# Altium footprint library CONNs.PcbLib: 27 footprints (part 2 of 2)
Each footprint in its own frame and in the unit in brackets; x right, y up, seen from the top. Pads: shape width x height; smd on the part's side, far side on the other; paste and mask are expansions set on the pad; w line width, h text height; cw(c..) or ccw(c..) is an arc to the next point about the centre after c.
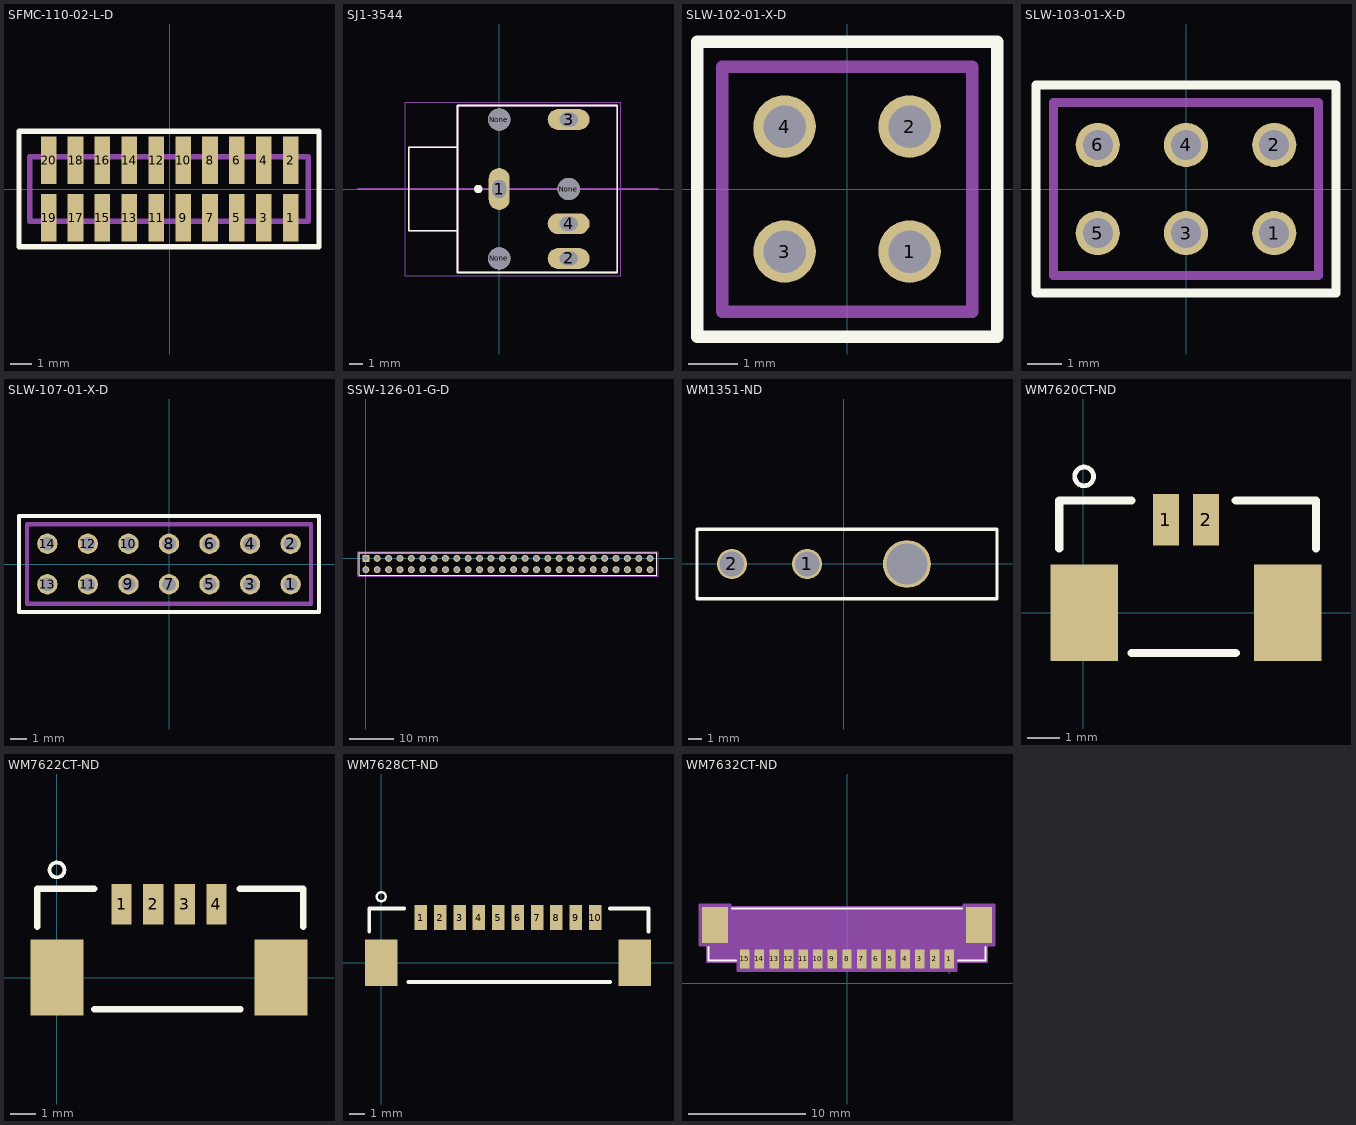
[diagram p1: the footprints below, top view; thin cyan lines are the x and y axes]

## SFMC-110-02-L-D [mil] "CONN RCPT 20POS 0.05 GOLD SMD"
height 179.92
pads (20):
  rect 29x88 smd: 1(225,-53.5) 2(225,53.5) 3(175,-53.5) 4(175,53.5) 5(125,-53.5) 6(125,53.5) 7(75,-53.5) 8(75,53.5) 9(25,-53.5) 10(25,53.5) 11(-25,-53.5) 12(-25,53.5) 13(-75,-53.5) 14(-75,53.5) 15(-125,-53.5) 16(-125,53.5) 17(-175,-53.5) 18(-175,53.5) 19(-225,-53.5) 20(-225,53.5)
Top Overlay:
  lines w10: -280,-107.5 -280,107.5 277.5,107.5 277.5,-107.5 -280,-107.5
Mechanical 1:
  lines w10: -260,-60 -260,60 257.5,60 257.5,-60 -260,-60
3D body "SFMC-110-02-L-D.stp": height 180, standoff -5, extent -257.5,-82.5 257.5,82.5

## SJ1-3544 [mm] "3.5mm audio jack"
height 11
pads (7):
  oval 1.508x3.016 hole 1 slot 1.3 at 90 deg: 1(0,0)
  oval 3.016x1.508 hole 1 slot 1.3 at 0 deg: 2(5,-5) 3(5,5) 4(5,-2.5)
  round 1.6 hole 1.6 unplated: None(0,-5) None(0,5) None(5,0)
Top Overlay:
  circle w0.3: c-1.5,0 r0.15
  lines w0.127: -3,-3 -6.5,-3 -6.5,3 -3,3 ; -3,-3 -3,-6 8.5,-6 8.5,6 -3,6 -3,3 ; -3,-3 -3,3
Mechanical 1:
  lines w0.127: -10.16,0 11.43,0 ; -3,-3 -6.5,-3 -6.5,3 -3,3 ; -3,-3 -3,3 ; -3,-3 -3,-6 8.5,-6 8.5,6 -3,6 -3,3
Mechanical 4:
  lines w0: -0.5,-0.75 -0.5,0.75 0.5,0.75 0.5,-0.75 -0.5,-0.75 ; 4.25,-5.5 5.75,-5.5 5.75,-4.5 4.25,-4.5 4.25,-5.5 ; 4.25,-3 5.75,-3 5.75,-2 4.25,-2 4.25,-3 ; 4.25,4.5 5.75,4.5 5.75,5.5 4.25,5.5 4.25,4.5
  lines w0.05: -6.75,-6.25 -6.75,6.25 8.75,6.25 8.75,-6.25 -6.75,-6.25
3D body: height 9.96, standoff -6.83, extent 2,2.5 2,2.5
3D body "[RBF] CUI_SJ1-3544 v1.step": height 11.4, standoff -3.6, extent -6.5,-6 8.5,6.2

## SLW-102-01-X-D [mil] "CONN RCPT 4POS 0.1 GOLD PCB"
height 179.92
pads (4):
  round 50 hole 34: 1(50,-50) 2(50,50) 3(-50,-50) 4(-50,50)
Top Overlay:
  lines w10: -120,-118 -120,118 120,118 120,-118 -120,-118
Mechanical 1:
  lines w10: -100,-98 -100,98 100,98 100,-98 -100,-98
3D body "SLW-102-01-G-D.stp": height 180, standoff -115, extent -100,-97.5 100,97.5

## SLW-103-01-X-D [mil] "CONN RCPT 6POS 0.1 GOLD PCB"
height 179.92
pads (6):
  round 50 hole 34: 1(100,-50) 2(100,50) 3(0,-50) 4(0,50) 5(-100,-50) 6(-100,50)
Top Overlay:
  lines w10: -170,-118 170,-118 170,118 -170,118 -170,-118
Mechanical 1:
  lines w10: -150,-98 150,-98 150,98 -150,98 -150,-98
3D body "SLW-103-01-G-D.stp": height 180, standoff -115, extent -150,-97.5 150,97.5

## SLW-107-01-X-D [mil]
pads (14):
  round 50 hole 34: 1(300,-50) 2(300,50) 3(200,-50) 4(200,50) 5(100,-50) 6(100,50) 7(0,-50) 8(0,50) 9(-100,-50) 10(-100,50) 11(-200,-50) 12(-200,50) 13(-300,-50) 14(-300,50)
Top Overlay:
  lines w10: -370,-118 370,-118 370,118 -370,118 -370,-118
Mechanical 1:
  lines w10: -350,-98 350,-98 350,98 -350,98 -350,-98
3D body "SLW-107-01-G-D.stp": height 180, standoff -115, extent -350,-97.5 350,97.5

## SSW-126-01-G-D [mm] "Elevated Socket, 2x26 Pins, Vertical, 2.54mm Pitch, Female"
height 8.51
pads (52):
  rect 1.55x1.55 hole 1.02: 1(0,0)
  round 1.55 hole 1.02: 2(0,-2.54) 3(2.54,0) 4(2.54,-2.54) 5(5.08,0) 6(5.08,-2.54) 7(7.62,0) 8(7.62,-2.54) 9(10.16,0) 10(10.16,-2.54) 11(12.7,0) 12(12.7,-2.54) 13(15.24,0) 14(15.24,-2.54) 15(17.78,0) 16(17.78,-2.54) 17(20.32,0) 18(20.32,-2.54) 19(22.86,0) 20(22.86,-2.54) 21(25.4,0) 22(25.4,-2.54) 23(27.94,0) 24(27.94,-2.54) 25(30.48,0) 26(30.48,-2.54) 27(33.02,0) 28(33.02,-2.54) 29(35.56,0) 30(35.56,-2.54) 31(38.1,0) 32(38.1,-2.54) 33(40.64,0) 34(40.64,-2.54) 35(43.18,0) 36(43.18,-2.54) 37(45.72,0) 38(45.72,-2.54) 39(48.26,0) 40(48.26,-2.54) 41(50.8,0) 42(50.8,-2.54) 43(53.34,0) 44(53.34,-2.54) 45(55.88,0) 46(55.88,-2.54) 47(58.42,0) 48(58.42,-2.54) 49(60.96,0) 50(60.96,-2.54) 51(63.5,0) 52(63.5,-2.54)
Top Overlay:
  lines w0.2: -1.525,-3.745 65.025,-3.745 65.025,1.205 -1.525,1.205 -1.525,-3.745
Mechanical 13:
  lines w0.1: -1.525,-3.745 -1.525,1.205 65.025,1.205 65.025,-3.745 -1.525,-3.745
Mechanical 15:
  lines w0.05: -1.75,-3.97 65.25,-3.97 65.25,1.43 -1.75,1.43 -1.75,-3.97
3D body "SSW-126-01-G-D.stp": height 8.51, standoff -2.64, extent -1.524,-3.746 65.024,1.207

## WM1351-ND [mm]
height 9.6
pads (3):
  round 2.2 hole 1.8: 1(-2.66,0) 2(-8.16,0)
  round 3.5 hole 3: ""(4.64,0)
Top Overlay:
  lines w0.254: -10.71,-2.55 -10.71,2.55 11.22,2.55 11.22,-2.55 -10.71,-2.55
3D body "039301020.stp": height 11.4, standoff -3.6, extent -8.824,-2.879 11.11,2.921

## WM7620CT-ND [mm] "Molex PicoBlade 53261 2 Pos"
height 3.2
pads (4):
  rect 0.8x1.6 smd: 1(2.575,2.9) 2(3.825,2.9)
  rect 2.1x3 smd: ""(0.025,0) ""(6.375,0)
Top Overlay:
  circle w0.15: c0.025,4.25 r0.293
  lines w0.254: -0.75,2 -0.75,3.5 1.5,3.5 ; 1.5,-1.25 4.75,-1.25 ; 4.75,3.5 7.25,3.5 7.25,2
3D body "[PicoBlade 2 Pos] 532610271.stp": height 3.4, standoff 0, extent -0.575,-1.838 7.075,3.362

## WM7622CT-ND [mm] "Molex 4-Pos PicoBlade 53261"
height 3.2
pads (6):
  rect 0.8x1.6 smd: 1(2.55,2.9) 2(3.8,2.9) 3(5.05,2.9) 4(6.3,2.9)
  rect 2.1x3 smd: ""(0,0) ""(8.85,0)
Top Overlay:
  circle w0.15: c0,4.25 r0.293
  lines w0.254: -0.775,2 -0.775,3.5 1.475,3.5 ; 1.475,-1.25 7.25,-1.25 ; 7.225,3.5 9.725,3.5 9.725,2
3D body "[PicoBlade 4 Pos] 532610471.stp": height 3.4, standoff 0, extent -0.63,-1.771 9.52,3.429

## WM7628CT-ND [mm] "Molex PicoBlade 53261 10-Pos"
height 4.7
pads (12):
  rect 0.8x1.6 smd: 1(2.55,2.9) 2(3.8,2.9) 3(5.05,2.9) 4(6.3,2.9) 5(7.55,2.9) 6(8.8,2.9) 7(10.05,2.9) 8(11.3,2.9) 9(12.55,2.9) 10(13.8,2.9)
  rect 2.1x3 smd: ""(0,0) ""(16.35,0)
Top Overlay:
  circle w0.15: c0,4.25 r0.293
  lines w0.254: -0.775,2 -0.775,3.5 1.475,3.5 ; 1.75,-1.25 14.75,-1.25 ; 14.75,3.5 17.25,3.5 17.25,2
3D body "[PicoBlade 10 Pos] 532611071.stp": height 3.4, standoff 0, extent -0.57,-1.737 17.08,3.463

## WM7632CT-ND [mil] "Molex PicoBlade 53261 15 Pos"
pads (17):
  rect 32x63 smd: 1(344.49,82.5) 2(295.28,82.5) 3(246.06,82.5) 4(196.85,82.5) 5(147.64,82.5) 6(98.43,82.5) 7(49.21,82.5) 8(0,82.5) 9(-49.21,82.5) 10(-98.43,82.5) 11(-147.64,82.5) 12(-196.85,82.5) 13(-246.06,82.5) 14(-295.28,82.5) 15(-344.49,82.5)
  rect 87x122 smd: ""(-444.88,196.67) ""(444.88,196.67)
Top Overlay:
  lines w6: -467.5,122.57 -467.5,77.5 -373.59,77.5 ; -388.28,252.5 388.28,252.5 ; 373.59,77.5 467.5,77.5 467.5,122.57
Mechanical 13:
  lines w1: 319.49,82.5 344.49,32.5 369.49,82.5 ; -462.5,82.5 -462.5,247.5 462.5,247.5 462.5,82.5 -462.5,82.5
Mechanical 15:
  region: 472.5,72.5 472.5,127 498,127 498,267 393,267 393,257.5 -393,257.5 -393,267 -498,267 -498,127 -472.5,127 -472.5,72.5 -370,72.5 -370,41 370,41 370,72.5
  lines w6: -498,127 -498,267 -393,267 -393,257.5 393,257.5 393,267 498,267 498,127 472.5,127 472.5,72.5 370,72.5 370,41 -370,41 -370,72.5 -472.5,72.5 -472.5,127 -498,127
3D body: height 10, standoff 0, extent 0,0 10,10
3D body "[PicoBlade 15 Pos] 532611571.stp": height 133.86, standoff 0, extent -470.47,58.67 470.48,263.4